# Altium footprint library Footprints.PcbLib: 266 footprints (part 2 of 17)
Each footprint in its own frame and in the unit in brackets; x right, y up, seen from the top. Pads: shape width x height; smd on the part's side, far side on the other; paste and mask are expansions set on the pad; w line width, h text height; cw(c..) or ccw(c..) is an arc to the next point about the centre after c.
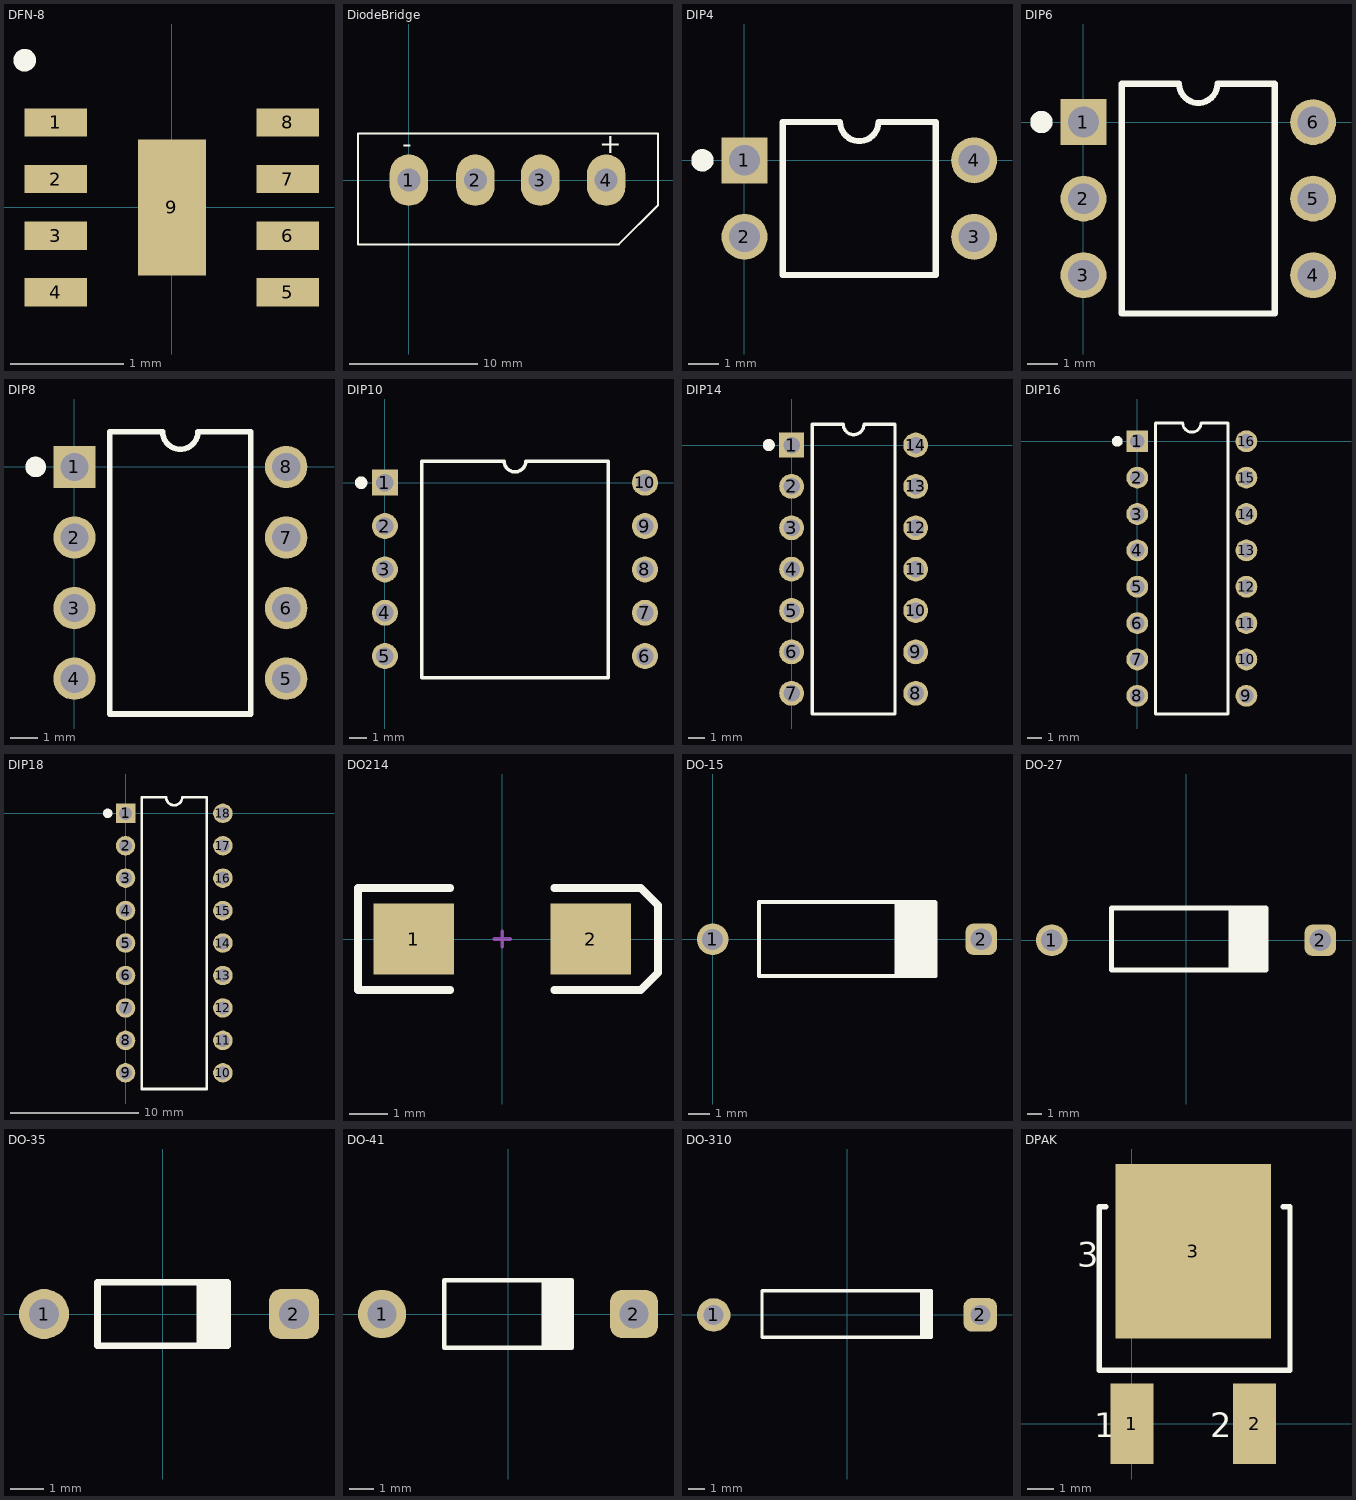
[diagram p1: the footprints below, top view; thin cyan lines are the x and y axes]

## DFN-8 [mm]
height 0.9
pads (9):
  rect 0.55x0.25 smd: 1(-1.025,0.75) 2(-1.025,0.25) 3(-1.025,-0.25) 4(-1.025,-0.75) 5(1.025,-0.75) 6(1.025,-0.25) 7(1.025,0.25) 8(1.025,0.75)
  rect 0.6x1.2 smd: 9(0,0)
Top Overlay:
  circle w0.1: c-1.3,1.3 r0.05
3D body: height 0.9, standoff 0, extent -1,-1 1,1

## DiodeBridge [mm]
pads (4):
  oval 3x4 hole 1.8: 1(0,0) 2(5.182,0) 3(10.236,0) 4(15.367,0)
Top Overlay:
  lines w0.152: -3.962,-5.004 -3.962,3.632 19.406,3.632 19.406,-1.956 16.358,-5.004 -3.962,-5.004
  text "+" at 14.834,2.108 h1.52
  text "-" at -0.533,2.108 h1.52
3D body "User Library-KBU.step": height 19.3, standoff -4.5, extent -3.878,-4.953 19.322,3.547

## DIP4 [mil]
pads (4):
  rect 60x60 hole 40: 1(0,0)
  round 60 hole 40: 2(0,-100) 3(300,-100) 4(300,0)
Top Overlay:
  circle w15: c-55,0 r7.07
  lines w8: 50,-150 50,50 125,50 ccw(c150,50) 175,50 250,50 250,-150 50,-150
3D body "DIP4.STEP": height 169.69, standoff -129.13, extent -7.47,-159.05 307.49,59.06

## DIP6 [mil]
pads (6):
  rect 60x60 hole 40: 1(0,0)
  round 60 hole 40: 2(0,-100) 3(0,-200) 4(300,-200) 5(300,-100) 6(300,0)
Top Overlay:
  circle w15: c-55,0 r7.07
  lines w8: 50,-250 50,50 125,50 ccw(c150,50) 175,50 250,50 250,-250 50,-250
3D body "DIP6.STEP": height 169.69, standoff -129.13, extent -7.48,-259.05 307.49,59.06

## DIP8 [mil]
height 100
pads (8):
  rect 60x60 hole 40: 1(0,0)
  round 60 hole 40: 2(0,-100) 3(0,-200) 4(0,-300) 5(300,-300) 6(300,-200) 7(300,-100) 8(300,0)
Top Overlay:
  circle w15: c-55,0 r7.07
  lines w8: 50,-350 250,-350 250,50 175,50 cw(c150,50) 125,50 50,50 50,-350
3D body "DIP8.STEP": height 200, standoff -137.8, extent -4.92,-359.84 304.93,70.09

## DIP10 [mil]
pads (10):
  rect 60x60 hole 40: 1(0,0)
  round 60 hole 40: 2(0,-100) 3(0,-200) 4(0,-300) 5(0,-400) 6(600,-400) 7(600,-300) 8(600,-200) 9(600,-100) 10(600,0)
Top Overlay:
  circle w15: c-55,0 r7.07
  lines w8: 85,-450 515,-450 515,50 325,50 cw(c300,50) 275,50 85,50 85,-450

## DIP14 [mil]
pads (14):
  rect 60x60 hole 40: 1(0,0)
  round 60 hole 40: 2(0,-100) 3(0,-200) 4(0,-300) 5(0,-400) 6(0,-500) 7(0,-600) 8(300,-600) 9(300,-500) 10(300,-400) 11(300,-300) 12(300,-200) 13(300,-100) 14(300,0)
Top Overlay:
  circle w15: c-55,0 r7.07
  lines w8: 50,-650 250,-650 250,50 175,50 cw(c150,50) 125,50 50,50 50,-650
3D body "DIP14.STEP": height 144.88, standoff -129.92, extent -5.7,-674.99 309.26,75.01

## DIP16 [mil]
pads (16):
  rect 60x60 hole 40: 1(0,0)
  round 60 hole 40: 2(0,-100) 3(0,-200) 4(0,-300) 5(0,-400) 6(0,-500) 7(0,-600) 8(0,-700) 9(300,-700) 10(300,-600) 11(300,-500) 12(300,-400) 13(300,-300) 14(300,-200) 15(300,-100) 16(300,0)
Top Overlay:
  circle w15: c-55,0 r7.07
  lines w8: 50,-750 50,50 125,50 ccw(c150,50) 175,50 250,50 250,-750 50,-750
3D body "DIP16.STEP": height 200.79, standoff -129.92, extent -4.91,-737.4 304.93,50

## DIP18 [mil]
pads (18):
  rect 60x60 hole 40: 1(0,0)
  round 60 hole 40: 2(0,-100) 3(0,-200) 4(0,-300) 5(0,-400) 6(0,-500) 7(0,-600) 8(0,-700) 9(0,-800) 10(300,-800) 11(300,-700) 12(300,-600) 13(300,-500) 14(300,-400) 15(300,-300) 16(300,-200) 17(300,-100) 18(300,0)
Top Overlay:
  circle w15: c-55,0 r7.07
  lines w8: 50,-850 250,-850 250,50 175,50 cw(c150,50) 125,50 50,50 50,-850
3D body "User Library-DIP18-300.step": height 200, standoff -98.03, extent -4.92,-852.57 304.92,52.55

## DO214 [mm] "DO-214-AC/SMA; 2 C-Bend Leads; Body 5.3 x 2.6 mm, inc. leads (LxW)"
height 2.3
pads (2):
  rect 2.1x1.85 smd: 1(-2.3,0) 2(2.3,0)
Top Overlay:
  lines w0.2: -1.35,-1.325 -3.75,-1.325 -3.75,1.325 -1.35,1.325 ; 1.35,-1.325 3.6,-1.325 4.05,-0.875 4.05,0.875 3.6,1.325 1.35,1.325
Mechanical 1:
  lines w0.1: -0.2,0 0.2,0 ; 0,-0.2 0,0.2

## DO-15 [mm]
pads (2):
  round 1.5 hole 1: 1(0,0)
  rrect50% 1.5x1.5 hole 1.016: 2(12.802,0)
Top Overlay:
  rectangle: 8.661,-1.753 10.719,1.753
  lines w0.2: 10.617,-1.753 2.21,-1.753 2.21,1.778 10.592,1.778 10.617,1.753
3D body "User Library-DO-15-3.step": height 3.71, standoff -1.91, extent -0.406,-1.82 13.208,1.82

## DO-27 [mm]
height 1.9
pads (2):
  round 2.2 hole 1.5: 1(-9.395,0)
  rrect50% 2.2x2.2 hole 1.5: 2(9.395,0)
Top Overlay:
  rectangle: 2.969,-2.07 5.763,2.248
  lines w0.356: 5.585,-2.07 -5.21,-2.07 -5.21,2.248 5.585,2.248
3D body "User Library-DO-201ADDO-27.step": height 5.87, standoff -3.75, extent -10.073,-2.782 10.067,2.858

## DO-35 [mm] "Diode, Axial; Body 3.8 x 1.9 mm (LxDia. max), Lead Dia. 0.53 mm (max)"
height 1.9
pads (2):
  round 1.5 hole 0.9: 1(-3.55,0)
  rrect50% 1.5x1.5 hole 0.9: 2(3.931,0)
Top Overlay:
  rectangle: 1.016,-0.95 2.05,0.95
  lines w0.2: 1.95,-0.95 -1.95,-0.95 -1.95,0.95 1.95,0.95
3D body "User Library-DO-35G-30.step": height 2.84, standoff -0.98, extent -3.831,-1.04 4.339,0.762

## DO-41 [mm] "Diode, Axial; Body 5.2 x 2.7 mm (LxDia. max), Lead Dia. 0.86 mm (max)"
height 2.8
pads (2):
  round 2 hole 1.2: 1(-5.23,0)
  rrect50% 2x2 hole 1.2: 2(5.23,0)
Top Overlay:
  rectangle: 1.397,-1.4 2.75,1.4
  lines w0.2: 2.65,-1.4 -2.65,-1.4 -2.65,1.4 2.65,1.4
3D body "User Library-DO-41-4.step": height 2.86, standoff -2.35, extent -5.68,-1.36 5.68,1.36

## DO-310 [mm]
pads (2):
  round 2 hole 1.2: 1(-7.976,0)
  rrect50% 2x2 hole 1.2: 2(7.976,0)
Top Overlay:
  rectangle: 4.356,-1.349 5.156,1.451
  lines w0.2: 5.055,-1.349 -5.088,-1.349 -5.088,1.451 5.055,1.451
3D body "User Library-DO-310.step": height 3.3, standoff -4.2, extent -8.525,-1.473 8.475,1.527

## DPAK [mil]
pads (3):
  rect 63x118 smd: 1(0,0) 2(180,0)
  rect 228x255.91 smd: 3(90,253)
Top Overlay:
  lines w8: -37.95,318.46 -47.95,318.46 -47.95,78.47 232.05,78.47 232.05,318.46 222.05,318.46
  text "2" at 115,-20 h36
  text "1" at -55,-20 h36
  text "3" at -80,230 h36
3D body "DPAK.STEP": height 94.49, standoff 0, extent -38.84,-23.82 221,373.82